# Altium footprint library Binh.PcbLib: 863 footprints (part 47 of 54)
Each footprint in its own frame and in the unit in brackets; x right, y up, seen from the top. Pads: shape width x height; smd on the part's side, far side on the other; paste and mask are expansions set on the pad; w line width, h text height; cw(c..) or ccw(c..) is an arc to the next point about the centre after c.
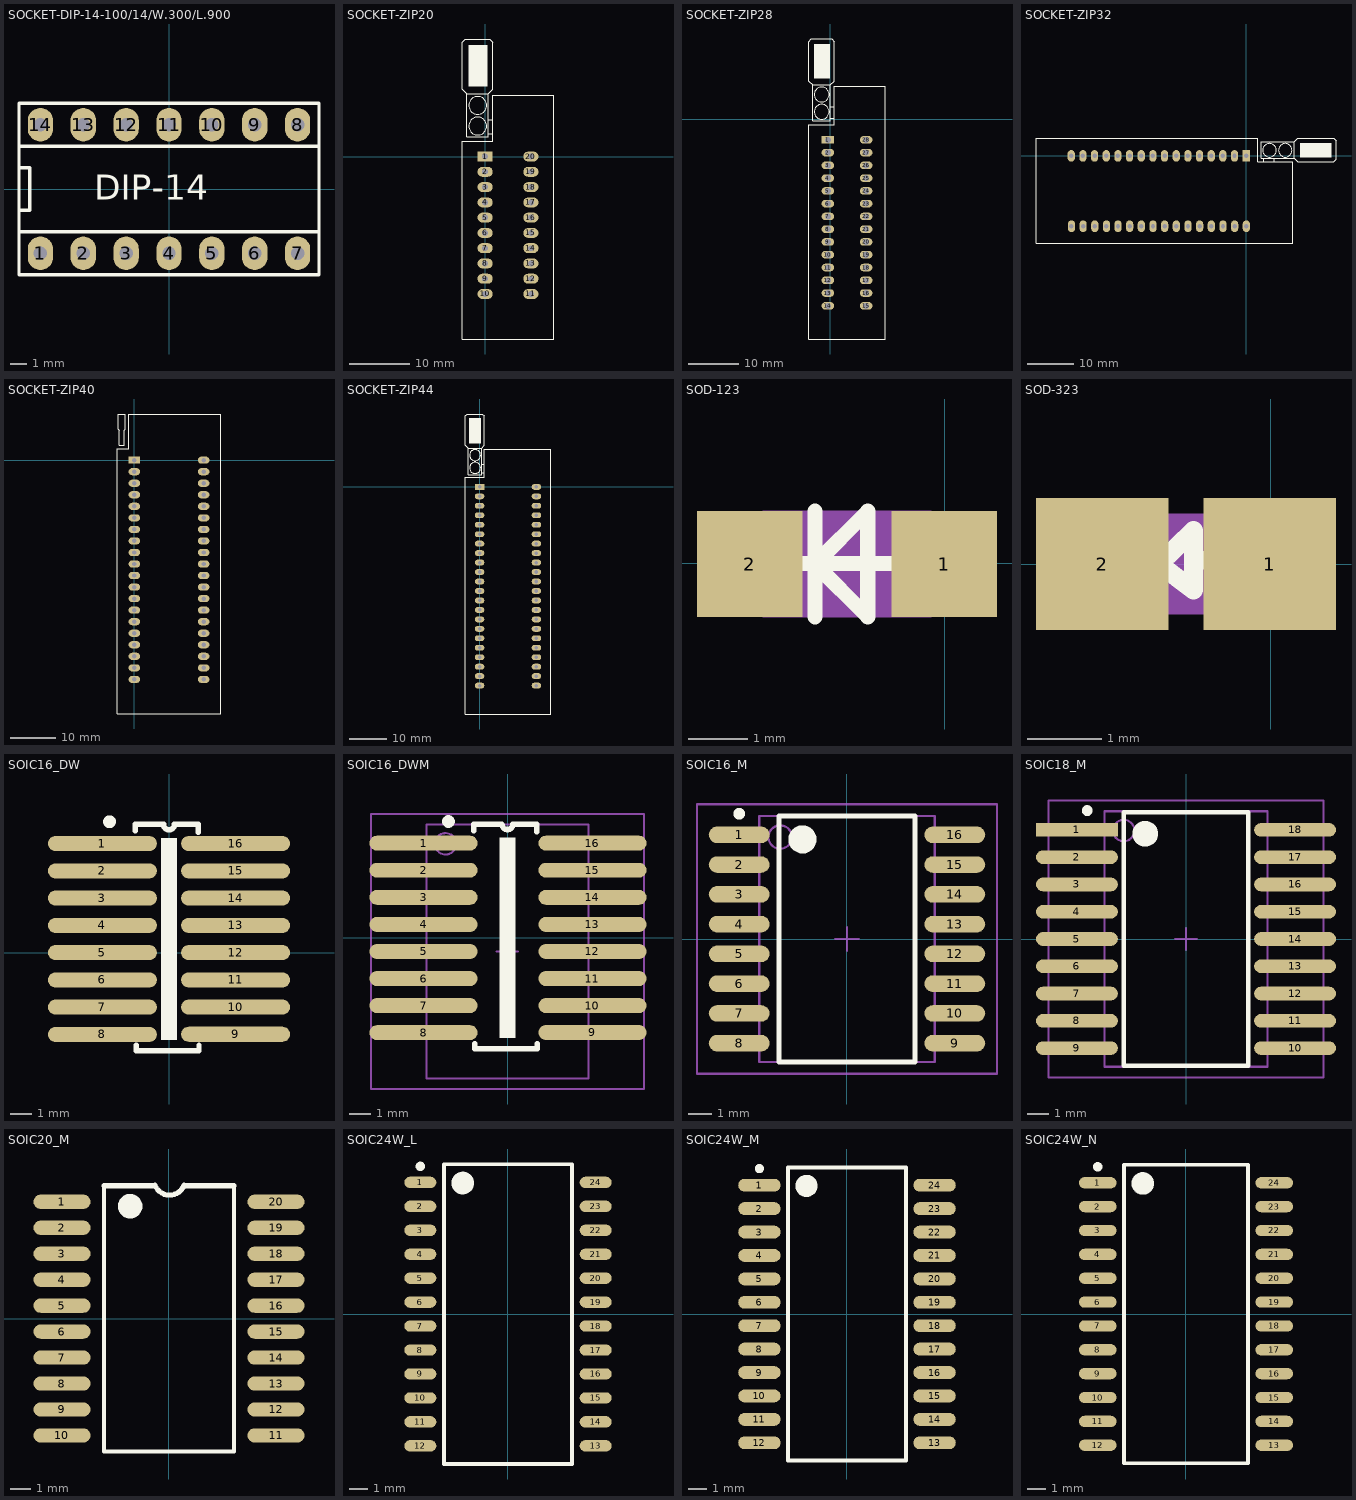
[diagram p46: the footprints below, top view; thin cyan lines are the x and y axes]

## SOCKET-DIP-14-100/14/W.300/L.900 [mm]
height 5.59
pads (14):
  oval 1.5x2 hole 0.8: 1(-7.62,-3.81) 2(-5.08,-3.81) 3(-2.54,-3.81) 4(0,-3.81) 5(2.54,-3.81) 6(5.08,-3.81) 7(7.62,-3.81) 8(7.62,3.81) 9(5.08,3.81) 10(2.54,3.81) 11(0,3.81) 12(-2.54,3.81) 13(-5.08,3.81) 14(-7.62,3.81)
Top Overlay:
  lines w0.203: -8.89,-2.54 8.89,-2.54 ; -8.89,-2.54 8.89,-2.54 ; -8.89,-2.54 -8.89,-1.27 ; -8.89,-2.54 -8.89,-1.27 ; -8.89,-1.27 -8.89,1.27 ; -8.89,-1.27 -8.255,-1.27 ; -8.89,-1.27 -8.89,1.27 ; -8.89,-1.27 -8.255,-1.27 ; -8.89,1.27 -8.89,2.54 ; -8.89,1.27 -8.255,1.27 ; -8.89,1.27 -8.89,2.54 ; -8.89,1.27 -8.255,1.27 ; -8.89,2.54 8.89,2.54 ; -8.89,2.54 8.89,2.54 ; -8.255,-1.27 -8.255,1.27 ; -8.255,-1.27 -8.255,1.27 ; 8.89,-2.54 8.89,2.54 ; -8.89,-5.08 -8.89,5.08 8.89,5.08 8.89,-5.08 -8.89,-5.08
  text "DIP-14" at -4.445,-0.635 h1.5
3D body "Socket 14.step": height 4.5, standoff -3.09, extent -8.89,-5.08 8.89,5.08

## SOCKET-ZIP20 [mil] "DIP 20, W 600mil/ L 1600mil"
height 300
pads (20):
  rect 100x65 hole 38: 1(0,0)
  oval 100x65 hole 38: 2(0,-100) 3(0,-200) 4(0,-300) 5(0,-400) 6(0,-500) 7(0,-600) 8(0,-700) 9(0,-800) 10(0,-900) 11(300,-900) 12(300,-800) 13(300,-700) 14(300,-600) 15(300,-500) 16(300,-400) 17(300,-300) 18(300,-200) 19(300,-100) 20(300,0)
Top Overlay:
  circle w7: c-48.31,335 r58.31
  circle w7: c-48.31,200 r58.31
  rectangle: -110,460 15,730
  lines w7: 20,150 50,150 ; 20,240 50,240 ; -120,410 -120,130 -110,130 20,130 20,410 ; -120,410 -150,440 -150,750 -130,770 30,770 50,750 50,440 20,410 ; -120,410 20,410 ; -150,-1195 -150,100 50,100 50,400 450,400 450,-1195 -150,-1195

## SOCKET-ZIP28 [mm]
height 0.305
pads (28):
  rect 2.5x1.5 hole 1.2: 1(-0.508,-4.064)
  oval 2.5x1.5 hole 1.2: 2(-0.508,-6.604) 3(-0.508,-9.144) 4(-0.508,-11.684) 5(-0.508,-14.224) 6(-0.508,-16.764) 7(-0.508,-19.304) 8(-0.508,-21.844) 9(-0.508,-24.384) 10(-0.508,-26.924) 11(-0.508,-29.464) 12(-0.508,-32.004) 13(-0.508,-34.544) 14(-0.508,-37.084) 15(7.112,-37.084) 16(7.112,-34.544) 17(7.112,-32.004) 18(7.112,-29.464) 19(7.112,-26.924) 20(7.112,-24.384) 21(7.112,-21.844) 22(7.112,-19.304) 23(7.112,-16.764) 24(7.112,-14.224) 25(7.112,-11.684) 26(7.112,-9.144) 27(7.112,-6.604) 28(7.112,-4.064)
Top Overlay:
  circle w0.178: c-1.735,4.953 r1.481
  circle w0.178: c-1.735,1.524 r1.481
  rectangle: -3.302,8.128 -0.127,14.986
  lines w0.178: 0,0.254 0.762,0.254 ; 0,2.54 0.762,2.54 ; -3.556,6.858 -3.556,-0.254 -3.302,-0.254 0,-0.254 0,6.858 ; -3.556,6.858 -4.318,7.62 -4.318,15.494 -3.81,16.002 0.254,16.002 0.762,15.494 0.762,7.62 0,6.858 ; -3.556,6.858 0,6.858 ; -4.318,-43.688 -4.318,-1.016 0.762,-1.016 0.762,6.604 10.922,6.604 10.922,-43.688 -4.318,-43.688

## SOCKET-ZIP32 [mil] "32 PIN, W 900 mil , L 2200 mil , Push Pro FOR Chip"
height 300
pads (32):
  rect 62x100 hole 38: 1(0,0)
  oval 62x100 hole 38: 2(-100,0) 3(-200,0) 4(-300,0) 5(-400,0) 6(-500,0) 7(-600,0) 8(-700,0) 9(-800,0) 10(-900,0) 11(-1000,0) 12(-1100,0) 13(-1200,0) 14(-1300,0) 15(-1400,0) 16(-1500,0) 17(-1498,-603) 18(-1398,-603) 19(-1298,-603) 20(-1198,-603) 21(-1099,-603) 22(-999,-603) 23(-899,-603) 24(-799,-603) 25(-699,-603) 26(-599,-603) 27(-499,-603) 28(-399,-603) 29(-299,-603) 30(-199,-603) 31(-99,-603) 32(1,-603)
Top Overlay:
  circle w7: c200,48.31 r58.31
  circle w7: c335,48.31 r58.31
  region: 460,110 460,-15 730,-15 730,110
  lines w7: 150,-50 150,-20 ; 240,-50 240,-20 ; 410,-20 410,120 ; 410,-20 130,-20 130,110 130,120 410,120 ; 410,-20 440,-50 750,-50 770,-30 770,130 750,150 440,150 410,120 ; -1802,-750 400,-750 400,-600 400,-50 100,-50 100,150 -1802,150 -1802,-750

## SOCKET-ZIP40 [mil] "40 PIN, W 900 mil , L 2600 mil , Push Pro FOR Chip"
height 300
pads (40):
  rect 100x62 hole 38: 1(0,0)
  oval 100x62 hole 38: 2(0,-100) 3(0,-200) 4(0,-300) 5(0,-400) 6(0,-500) 7(0,-600) 8(0,-700) 9(0,-800) 10(0,-900) 11(0,-1000) 12(0,-1100) 13(0,-1200) 14(0,-1300) 15(0,-1400) 16(0,-1500) 17(0,-1600) 18(0,-1700) 19(0,-1800) 20(0,-1900) 21(600,-1900) 22(600,-1800) 23(600,-1700) 24(600,-1600) 25(600,-1500) 26(600,-1400) 27(600,-1300) 28(600,-1200) 29(600,-1100) 30(600,-1000) 31(600,-900) 32(600,-800) 33(600,-700) 34(600,-600) 35(600,-500) 36(600,-400) 37(600,-300) 38(600,-200) 39(600,-100) 40(600,0)
Top Overlay:
  lines w7: -150,100 -150,-2200 750,-2200 750,400 600,400 50,400
  lines w7.01: -150,100 -50,100 -50,400 50,400 ; -140,270 -130,260 -130,130 -110,130 -90,130 -90,260 -80,270 -80,400 -140,400 -140,270
3D body "SW3dPS-zif.STEP": height 443.07, standoff -186.85, extent -189.6,-2144.51 750,894.51

## SOCKET-ZIP44 [mil] "40 PIN, W 900 mil , L 2600 mil , Push Pro FOR Chip"
height 300
pads (44):
  rect 100x62 hole 38: 1(0,0)
  oval 100x62 hole 38: 2(0,-100) 3(0,-200) 4(0,-300) 5(0,-400) 6(0,-500) 7(0,-600) 8(0,-700) 9(0,-800) 10(0,-900) 11(0,-1000) 12(0,-1100) 13(0,-1200) 14(0,-1300) 15(0,-1400) 16(0,-1500) 17(0,-1600) 18(0,-1700) 19(0,-1800) 20(0,-1900) 21(0,-2000) 22(0,-2100) 23(600,-2100) 24(600,-2000) 25(600,-1900) 26(600,-1800) 27(600,-1700) 28(600,-1600) 29(600,-1500) 30(600,-1400) 31(600,-1300) 32(600,-1200) 33(600,-1100) 34(600,-1000) 35(600,-900) 36(600,-800) 37(600,-700) 38(600,-600) 39(600,-500) 40(600,-400) 41(600,-300) 42(600,-200) 43(600,-100) 44(600,0)
Top Overlay:
  circle w7: c-48.31,335 r58.31
  circle w7: c-48.31,200 r58.31
  rectangle: -110,460 15,730
  lines w7: 20,150 50,150 ; 20,240 50,240 ; -120,410 -120,130 -110,130 20,130 20,410 ; -120,410 -150,440 -150,750 -130,770 30,770 50,750 50,440 20,410 ; -120,410 20,410 ; -150,-2400 -150,100 50,100 50,400 600,400 750,400 750,-2400 -150,-2400

## SOD-123 [mil]
pads (2):
  rect 70x70 smd: 1(-0.46,-0.41) 2(-129.46,-0.41)
Top Overlay:
  lines w10: -157.48,-19.68 -157.48,19.68 ; -102.36,0 -31.5,0 ; -86.18,-35.41 -86.18,34.59 ; -86.18,-0.41 -51.18,-35.41 -51.18,34.59 -86.18,-0.41
Mechanical 2:
  rectangle: -140.96,-14.41 11.04,13.59
  rectangle: -120.96,-35.91 -8.96,35.09
3D body "SOD123.STEP": height 46.46, standoff 0, extent -141.77,-35.43 11.77,35.43

## SOD-323 [mil]
pads (2):
  rect 70x70 smd: 1(-0.47,0.05) 2(-89.05,0.05)
Top Overlay:
  lines w10: -59.52,-22.58 -59.52,23.68 ; -40.82,2.02 -18.18,2.02 ; -59.05,0.05 -40.82,17.77 -40.82,-13.73 -59.05,0.05
Mechanical 2:
  rectangle: -80.19,-26.52 -9.32,26.63
  rectangle: -97.91,-7.82 8.39,7.93
3D body "SOD323.STEP": height 43.31, standoff 0, extent -103.15,-24.6 3.15,24.6

## SOIC16_DW [mm] "SOIC, 16-Leads, Body 10x3.8mm, Pitch 1.27mm"
height 2.65
pads (16):
  oval 5.08x0.7 smd: 1(-3.1,5.08) 2(-3.1,3.81) 3(-3.1,2.54) 4(-3.1,1.27) 5(-3.1,0) 6(-3.1,-1.27) 7(-3.1,-2.54) 8(-3.1,-3.81) 9(3.1,-3.8) 10(3.1,-2.54) 11(3.1,-1.27) 12(3.1,0) 13(3.1,1.27) 14(3.1,2.54) 15(3.1,3.81) 16(3.1,5.08)
Top Overlay:
  circle w0.4: c-2.767,6.096 r0.1
  rectangle: -0.381,-4.064 0.381,5.334
  lines w0.254: -1.575,5.664 -1.575,5.969 -0.254,5.969 ccw(c0,5.969) 0.254,5.969 1.372,5.969 1.372,5.613 ; -1.524,-4.318 -1.524,-4.572 1.397,-4.572 1.397,-4.318

## SOIC16_DWM [mm] "SOIC, 16-Leads, Body 10x3.8mm, Pitch 0.3inc"
height 2.65
pads (16):
  oval 5.08x0.7 smd: 1(-3.963,4.445) 2(-3.963,3.175) 3(-3.963,1.905) 4(-3.963,0.635) 5(-3.963,-0.635) 6(-3.963,-1.905) 7(-3.963,-3.175) 8(-3.963,-4.445) 9(3.963,-4.435) 10(3.963,-3.175) 11(3.963,-1.905) 12(3.963,-0.635) 13(3.963,0.635) 14(3.963,1.905) 15(3.963,3.175) 16(3.963,4.445)
Top Overlay:
  circle w0.4: c-2.793,5.461 r0.1
  rectangle: -0.407,-4.699 0.355,4.699
  lines w0.254: -1.601,5.029 -1.601,5.334 -0.28,5.334 ccw(c-0.026,5.334) 0.228,5.334 1.346,5.334 1.346,4.978 ; -1.55,-4.953 -1.55,-5.207 1.371,-5.207 1.371,-4.953
Mechanical 13:
  circle w0.1: c-2.926,4.415 r0.5
  lines w0.1: -3.826,-6.585 -3.826,5.315 3.774,5.315 3.774,-6.585 -3.826,-6.585
Mechanical 15:
  lines w0.1: -0.526,-0.635 0.474,-0.635 ; -0.026,-1.135 -0.026,-0.135 ; -6.426,-7.085 -6.426,5.815 6.374,5.815 6.374,-7.085 -6.426,-7.085
3D body: height 2.65, standoff 0, extent -3.826,-6.585 3.774,5.315

## SOIC16_M [mm] "16-Pin Small Outline Integrated Circuit Package (SOIC16), IPC Low Density"
height 2.65
pads (16):
  oval 2.6x0.7 smd: 1(-4.6,4.445) 2(-4.6,3.175) 3(-4.6,1.905) 4(-4.6,0.635) 5(-4.6,-0.635) 6(-4.6,-1.905) 7(-4.6,-3.175) 8(-4.6,-4.445) 9(4.6,-4.445) 10(4.6,-3.175) 11(4.6,-1.905) 12(4.6,-0.635) 13(4.6,0.635) 14(4.6,1.905) 15(4.6,3.175) 16(4.6,4.445)
Top Overlay:
  circle w0.6: c-1.9,4.25 r0.3
  circle w0.25: c-4.6,5.345 r0.125
  lines w0.2: -2.9,-5.25 2.9,-5.25 2.9,5.25 -2.9,5.25 -2.9,-5.25
Mechanical 13:
  circle w0.1: c-2.85,4.35 r0.5
  lines w0.1: -3.75,-5.25 3.75,-5.25 3.75,5.25 -3.75,5.25 -3.75,-5.25
Mechanical 15:
  lines w0.1: -0.5,0 0.5,0 ; 0,-0.5 0,0.5 ; -6.4,-5.75 6.4,-5.75 6.4,5.75 -6.4,5.75 -6.4,-5.75
3D body: height 2.65, standoff 0, extent -3.75,-5.25 3.75,5.25

## SOIC18_M [mil] "SOIC, 18-Leads, Body 11.6x7.5mm, Pitch 1.27mm, IPC Low Density"
height 104.33
pads (18):
  rect 150x25 smd: 1(-200,200)
  oval 150x25 smd: 2(-200,150) 3(-200,100) 4(-200,50) 5(-200,0) 6(-200,-50) 7(-200,-100) 8(-200,-150) 9(-200,-200) 10(200,-200) 11(200,-150) 12(200,-100) 13(200,-50) 14(200,0) 15(200,50) 16(200,100) 17(200,150) 18(200,200)
Top Overlay:
  circle w23.62: c-74.8,192.91 r11.81
  circle w9.84: c-181.1,235.43 r4.92
  lines w7.87: -114.17,-232.28 114.17,-232.28 114.17,232.28 -114.17,232.28 -114.17,-232.28
Mechanical 13:
  circle w3.94: c-114.17,198.82 r19.68
  lines w3.94: -149.61,-234.25 149.61,-234.25 149.61,234.25 -149.61,234.25 -149.61,-234.25
Mechanical 15:
  lines w3.94: -19.68,0 19.69,0 ; 0,-19.68 0,19.68 ; -251.97,-253.94 251.97,-253.94 251.97,253.94 -251.97,253.94 -251.97,-253.94

## SOIC20_M [mm] "20-Pin Small Outline Integrated Circuit 1.27 mm Pitch, IPC Low Density"
height 2.65
pads (20):
  oval 2.794x0.7 smd: 1(-5.235,5.715) 2(-5.235,4.445) 3(-5.235,3.175) 4(-5.235,1.905) 5(-5.235,0.635) 6(-5.235,-0.635) 7(-5.235,-1.905) 8(-5.235,-3.175) 9(-5.235,-4.445) 10(-5.235,-5.715) 11(5.235,-5.715) 12(5.235,-4.445) 13(5.235,-3.175) 14(5.235,-1.905) 15(5.235,-0.635) 16(5.235,0.635) 17(5.235,1.905) 18(5.235,3.175) 19(5.235,4.445) 20(5.235,5.715)
Top Overlay:
  circle w0.6: c-1.9,5.5 r0.3
  lines w0.2: -3.175,6.5 -3.175,-6.5 3.175,-6.5 3.175,6.5
  lines w0.254: -3.175,6.5 -0.785,6.5 ; -0.692,6.535 ccw(c0.022,6.802) 0.73,6.522 ; 0.785,6.5 3.175,6.5

## SOIC24W_L [mm] "SOIC, 24-Leads, Body 15.4x7.5mm, Pitch 1.27mm, IPC High Density"
height 2.67
pads (24):
  oval 1.7x0.6 smd: 1(-4.65,6.985) 2(-4.65,5.715) 3(-4.65,4.445) 4(-4.65,3.175) 5(-4.65,1.905) 6(-4.65,0.635) 7(-4.65,-0.635) 8(-4.65,-1.905) 9(-4.65,-3.175) 10(-4.65,-4.445) 11(-4.65,-5.715) 12(-4.65,-6.985) 13(4.65,-6.985) 14(4.65,-5.715) 15(4.65,-4.445) 16(4.65,-3.175) 17(4.65,-1.905) 18(4.65,-0.635) 19(4.65,0.635) 20(4.65,1.905) 21(4.65,3.175) 22(4.65,4.445) 23(4.65,5.715) 24(4.65,6.985)
Top Overlay:
  circle w0.6: c-2.4,6.95 r0.3
  circle w0.25: c-4.65,7.835 r0.125
  lines w0.2: -3.4,-7.95 3.4,-7.95 3.4,7.95 -3.4,7.95 -3.4,-7.95

## SOIC24W_M [mm] "SOIC, 24-Leads, Body 15.4x7.5mm, Pitch 1.27mm, IPC Low Density"
height 2.67
pads (24):
  oval 2.3x0.7 smd: 1(-4.75,6.985) 2(-4.75,5.715) 3(-4.75,4.445) 4(-4.75,3.175) 5(-4.75,1.905) 6(-4.75,0.635) 7(-4.75,-0.635) 8(-4.75,-1.905) 9(-4.75,-3.175) 10(-4.75,-4.445) 11(-4.75,-5.715) 12(-4.75,-6.985) 13(4.75,-6.985) 14(4.75,-5.715) 15(4.75,-4.445) 16(4.75,-3.175) 17(4.75,-1.905) 18(4.75,-0.635) 19(4.75,0.635) 20(4.75,1.905) 21(4.75,3.175) 22(4.75,4.445) 23(4.75,5.715) 24(4.75,6.985)
Top Overlay:
  circle w0.25: c-4.75,7.885 r0.125
  circle w0.6: c-2.2,6.95 r0.3
  lines w0.2: -3.2,-7.95 -3.2,7.95 3.2,7.95 3.2,-7.95 -3.2,-7.95

## SOIC24W_N [mm] "SOIC, 24-Leads, Body 15.4x7.5mm, Pitch 1.27mm, IPC Medium Density"
height 2.67
pads (24):
  oval 2x0.6 smd: 1(-4.7,6.985) 2(-4.7,5.715) 3(-4.7,4.445) 4(-4.7,3.175) 5(-4.7,1.905) 6(-4.7,0.635) 7(-4.7,-0.635) 8(-4.7,-1.905) 9(-4.7,-3.175) 10(-4.7,-4.445) 11(-4.7,-5.715) 12(-4.7,-6.985) 13(4.7,-6.985) 14(4.7,-5.715) 15(4.7,-4.445) 16(4.7,-3.175) 17(4.7,-1.905) 18(4.7,-0.635) 19(4.7,0.635) 20(4.7,1.905) 21(4.7,3.175) 22(4.7,4.445) 23(4.7,5.715) 24(4.7,6.985)
Top Overlay:
  circle w0.25: c-4.7,7.835 r0.125
  circle w0.6: c-2.3,6.95 r0.3
  lines w0.2: -3.3,-7.95 -3.3,7.95 3.3,7.95 3.3,-7.95 -3.3,-7.95